# Altium footprint library PcbLib1.PcbLib: 105 footprints (part 3 of 7)
Each footprint in its own frame and in the unit in brackets; x right, y up, seen from the top. Pads: shape width x height; smd on the part's side, far side on the other; paste and mask are expansions set on the pad; w line width, h text height; cw(c..) or ccw(c..) is an arc to the next point about the centre after c.
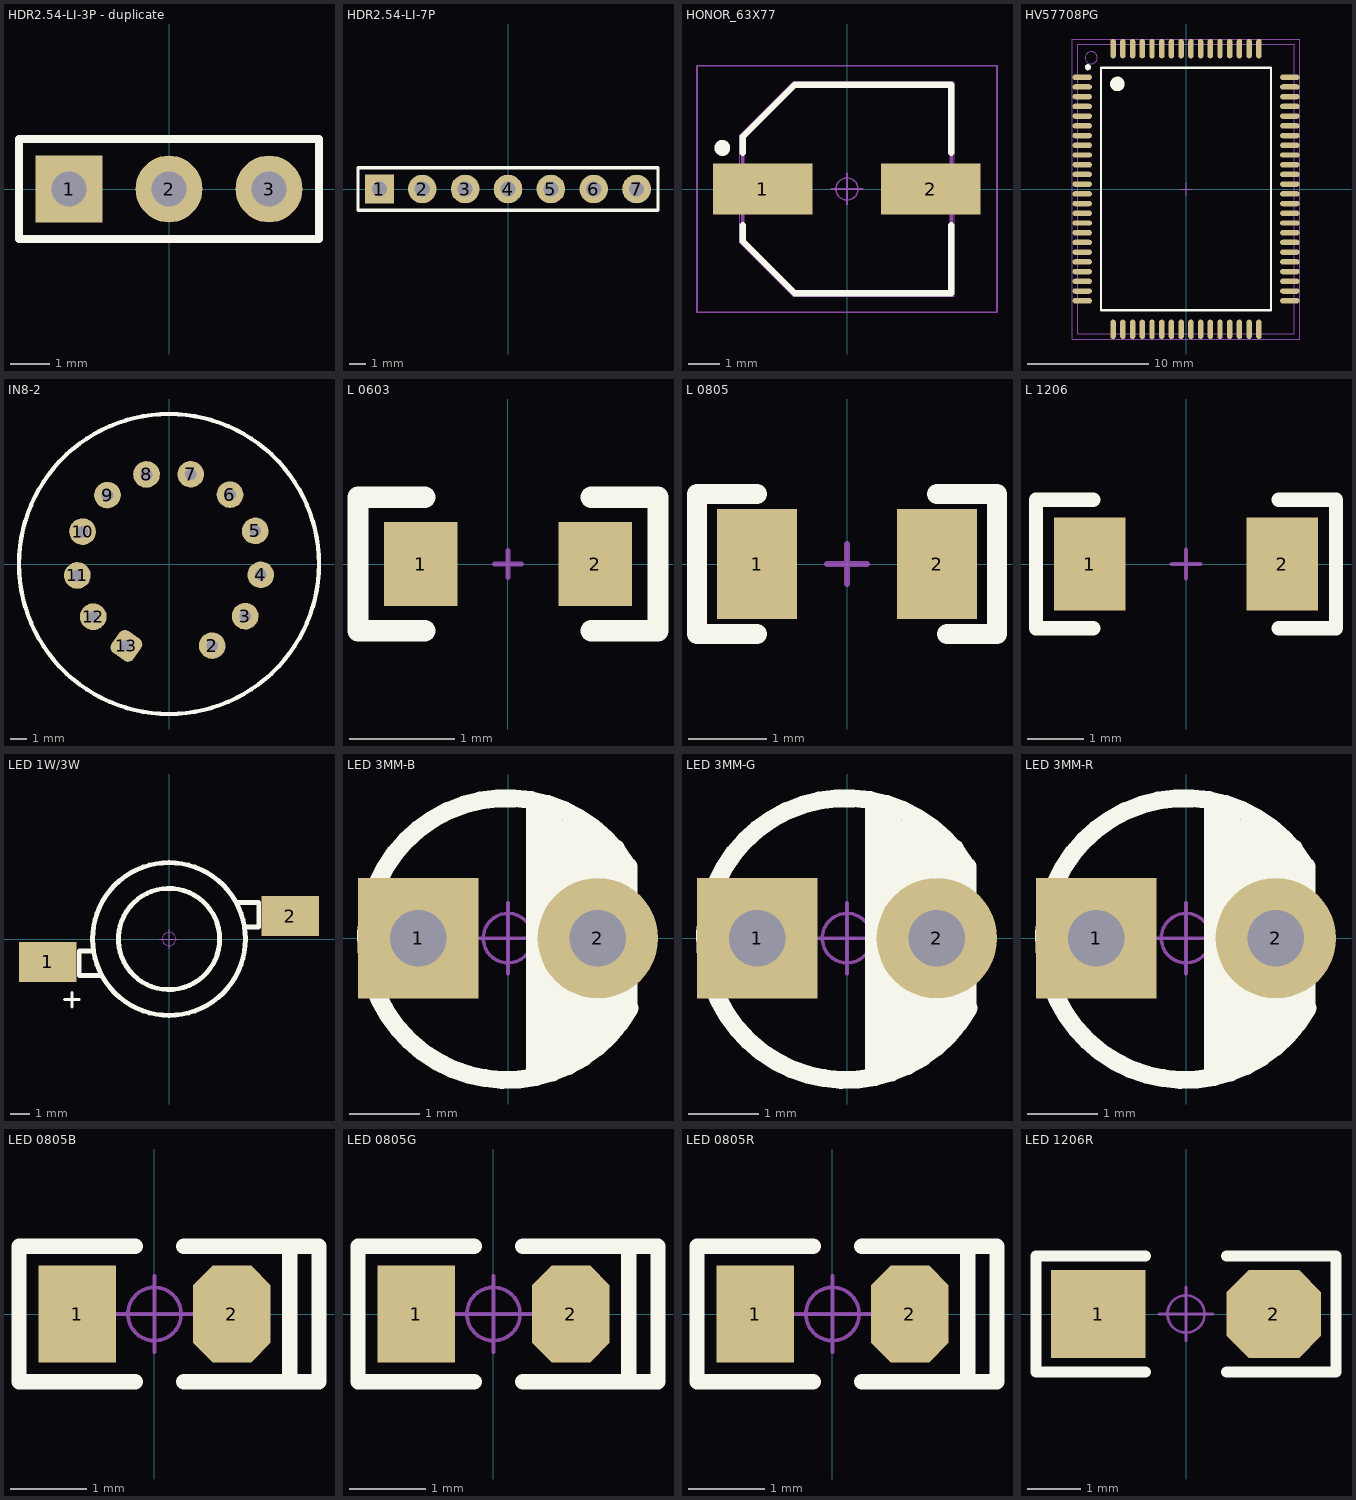
[diagram p2: the footprints below, top view; thin cyan lines are the x and y axes]

## HDR2.54-LI-3P - duplicate [mm] "排针，3脚"
pads (3):
  rect 1.7x1.7 hole 0.9: 1(-2.54,0)
  round 1.7 hole 0.9: 2(0,0) 3(2.54,0)
Top Overlay:
  lines w0.2: -3.81,-1.27 -3.81,1.27 3.81,1.27 3.81,-1.27 -3.81,-1.27

## HDR2.54-LI-7P [mm] "排针，7脚"
pads (7):
  rect 1.7x1.7 hole 0.9: 1(-7.62,0)
  round 1.7 hole 0.9: 2(-5.08,0) 3(-2.54,0) 4(0,0) 5(2.54,0) 6(5.08,0) 7(7.62,0)
Top Overlay:
  lines w0.2: -8.89,-1.27 8.89,-1.27 8.89,1.27 -8.89,1.27 -8.89,-1.27
3D body "HDR2.54-1P.STEP": height 8.5, standoff -3, extent 6.35,-1.27 8.89,1.27
3D body "HDR2.54-1P.STEP": height 8.5, standoff -3, extent 3.81,-1.27 6.35,1.27
3D body "HDR2.54-1P.STEP": height 8.5, standoff -3, extent 1.27,-1.27 3.81,1.27
3D body "HDR2.54-1P.STEP": height 8.5, standoff -3, extent -1.27,-1.27 1.27,1.27
3D body "HDR2.54-1P.STEP": height 8.5, standoff -3, extent -3.81,-1.27 -1.27,1.27
3D body "HDR2.54-1P.STEP": height 8.5, standoff -3, extent -6.35,-1.27 -3.81,1.27
3D body "HDR2.54-1P.STEP": height 8.5, standoff -3, extent -8.89,-1.27 -6.35,1.27

## HONOR_63X77 [mm]
pads (2):
  rect 3.15x1.6 smd: 1(-2.667,0) 2(2.65,0)
Top Overlay:
  circle w0.25: c-3.95,1.3 r0.125
  lines w0.2: -3.3,-1.15 -3.3,-1.65 -1.65,-3.3 3.3,-3.3 3.3,-1.15 ; -3.3,1.15 -3.3,1.65 -1.65,3.3 3.3,3.3 3.3,1.15
Mechanical 1:
  lines w0.1: -3.3,-1.65 -3.3,1.65 -1.65,3.3 3.3,3.3 3.3,-3.3 -1.65,-3.3 -3.3,-1.65
Mechanical 16:
  circle w0.05: c0,0 r0.35
  lines w0.001: -3.4,-1.7 -3.4,1.7 -1.7,3.4 3.4,3.4 3.4,-3.4 -1.7,-3.4 -3.4,-1.7
  lines w0.05: -0.5,0 0.5,0 ; 0,-0.5 0,0.5 ; -4.75,-3.9 -4.75,3.9 4.75,3.9 4.75,-3.9 -4.75,-3.9

## HV57708PG [mm]
pads (80):
  oval 1.6x0.45 smd: 1(-8.55,9.2) 2(-8.55,8.4) 3(-8.55,7.6) 4(-8.55,6.8) 5(-8.55,6) 6(-8.55,5.2) 7(-8.55,4.4) 8(-8.55,3.6) 9(-8.55,2.8) 10(-8.55,2) 11(-8.55,1.2) 12(-8.55,0.4) 13(-8.55,-0.4) 14(-8.55,-1.2) 15(-8.55,-2) 16(-8.55,-2.8) 17(-8.55,-3.6) 18(-8.55,-4.4) 19(-8.55,-5.2) 20(-8.55,-6) 21(-8.55,-6.8) 22(-8.55,-7.6) 23(-8.55,-8.4) 24(-8.55,-9.2) 41(8.55,-9.2) 42(8.55,-8.4) 43(8.55,-7.6) 44(8.55,-6.8) 45(8.55,-6) 46(8.55,-5.2) 47(8.55,-4.4) 48(8.55,-3.6) 49(8.55,-2.8) 50(8.55,-2) 51(8.55,-1.2) 52(8.55,-0.4) 53(8.55,0.4) 54(8.55,1.2) 55(8.55,2) 56(8.55,2.8) 57(8.55,3.6) 58(8.55,4.4) 59(8.55,5.2) 60(8.55,6) 61(8.55,6.8) 62(8.55,7.6) 63(8.55,8.4) 64(8.55,9.2)
  oval 0.45x1.6 smd: 25(-6,-11.55) 26(-5.2,-11.55) 27(-4.4,-11.55) 28(-3.6,-11.55) 29(-2.8,-11.55) 30(-2,-11.55) 31(-1.2,-11.55) 32(-0.4,-11.55) 33(0.4,-11.55) 34(1.2,-11.55) 35(2,-11.55) 36(2.8,-11.55) 37(3.6,-11.55) 38(4.4,-11.55) 39(5.2,-11.55) 40(6,-11.55) 65(6,11.55) 66(5.2,11.55) 67(4.4,11.55) 68(3.6,11.55) 69(2.8,11.55) 70(2,11.55) 71(1.2,11.55) 72(0.4,11.55) 73(-0.4,11.55) 74(-1.2,11.55) 75(-2,11.55) 76(-2.8,11.55) 77(-3.6,11.55) 78(-4.4,11.55) 79(-5.2,11.55) 80(-6,11.55)
Top Overlay:
  circle w0.25: c-8.075,10.025 r0.125
  circle w0.6: c-5.65,8.65 r0.3
  lines w0.2: -7,-10 -7,10 7,10 7,-10 -7,-10
Mechanical 13:
  circle w0.1: c-7.8,10.8 r0.5
  lines w0.1: -8.9,-11.9 -8.9,11.9 8.9,11.9 8.9,-11.9 -8.9,-11.9
Mechanical 15:
  lines w0.05: -9.35,-12.35 -9.35,12.35 9.35,12.35 9.35,-12.35 -9.35,-12.35
  lines w0.1: -0.5,0 0.5,0 ; 0,-0.5 0,0.5
3D body "User Library-QFP80_080.sldprt": height 3.4, standoff 0, extent -8.95,-11.95 8.95,11.95

## IN8-2 [mm]
pads (12):
  round 1.6 hole 0.7: 2(2.592,-4.896) 3(4.571,-3.131) 4(5.502,-0.648) 5(5.172,1.985) 6(3.657,4.161) 7(1.305,5.384) 8(-1.347,5.374) 9(-3.69,4.133) 10(-5.187,1.945) 11(-5.497,-0.689) 12(-4.548,-3.164)
  rrect50% 1.6x1.6 hole 0.7 rot 145: 13(-2.556,-4.915)
Top Overlay:
  circle w0.254: c0,0 r9
3D body "User Library-IN-14-1.sldprt": height 61, standoff 0, extent -9.488,-9.5 9.488,9.5

## L 0603 [mm] "小功率贴片电感        淘宝ID:黄晶宝石"
pads (2):
  rect 0.7x0.8 smd: 1(-0.83,0) 2(0.83,0)
Top Overlay:
  lines w0.203: -0.793,-0.635 -1.428,-0.635 -1.428,0.635 -0.793,0.635 ; 0.793,-0.635 1.428,-0.635 1.428,0.635 0.793,0.635
Mechanical 15:
  lines w0.051: -0.127,0 0.127,0 ; 0,-0.127 0,0 0,0.127
3D body "0603.STEP": height 0.8, standoff 0, extent -0.8,-0.4 0.8,0.4

## L 0805 [mil] "小功率贴片电感        淘宝ID:黄晶宝石"
pads (2):
  rect 40x55 smd: 1(-45,0) 2(45,0)
Top Overlay:
  lines w10: -45,-35 -75,-35 -75,35 -45,35 ; 45,35 75,35 75,-35 50,-35
Mechanical 15:
  lines w3: -10,0 10,0 ; 0,-10 0,10
3D body "0805.STEP": height 35.43, standoff -0.11, extent -39.37,-23.62 39.37,23.62

## L 1206 [mil] "小功率贴片电感        淘宝ID:黄晶宝石"
pads (2):
  rect 50x65 smd: 1(-67.5,0) 2(67.5,0)
Top Overlay:
  lines w10: -65,-45 -105,-45 -105,45 -65,45 ; 65,-45 105,-45 105,45 65,45
Mechanical 15:
  lines w3: -10,0 10,0 ; 0,-10 0,10
3D body "1206.STEP": height 35.43, standoff -0.19, extent -62.99,-31.5 62.99,31.5

## LED 1W/3W [mm] "大功率LED                      淘宝ID:黄晶宝石"
pads (2):
  rect 3x2.1 smd: 1(-6.35,-1.2) 2(6.35,1.2)
Top Overlay:
  circle w0.254: c0,0 r2.65
  circle w0.254: c0,0 r4
  lines w0.15: -5.461,-3.175 -4.699,-3.175 ; -5.08,-3.556 -5.08,-2.794
  lines w0.254: -4.064,-0.635 -4.699,-0.635 -4.699,-1.905 -3.556,-1.905 ; 3.556,1.905 4.699,1.905 4.699,0.635 4.064,0.635
Mechanical 15:
  circle w0.05: c0,0 r0.35
  lines w0.05: -0.5,0 0.5,0 ; 0,-0.5 0,0.5
3D body "User Library-LED Case Lambertian II_Imported.sldprt": height 0.22, standoff -0.08, extent -2.629,-2.6 2.565,2.59
3D body "User Library-LED Case Lambertian II_Imported1.sldprt": height 2.62, standoff 0.22, extent -3.732,-3.988 3.668,3.988
3D body "User Library-LED Case Lambertian II_Imported2.sldprt": height 2.42, standoff 2.22, extent -1.239,-1.124 1.161,1.276
3D body "User Library-LED Case Lambertian II_Imported3.sldprt": height 5.49, standoff 2.39, extent -3.132,-3.1 3.066,3.091
3D body "User Library-LED Case Lambertian II_Imported5.sldprt": height 2.62, standoff 2.12, extent -3.52,-3.5 3.456,3.5
3D body "User Library-LED Case Lambertian II_Imported6.sldprt": height 1.52, standoff 0.02, extent 3.548,0.338 7.148,1.838
3D body "User Library-LED Case Lambertian II_Imported8.sldprt": height 1.52, standoff 0.02, extent -7.211,-1.838 -3.611,-0.338
3D body "User Library-LED Case Lambertian II_Imported9.sldprt": height 1.52, standoff 1.42, extent -4.219,0.038 -3.619,1.538
3D body "User Library-LED Case Lambertian II_Imported7.sldprt": height 1.52, standoff 1.42, extent 3.549,-1.538 4.649,-0.038

## LED 3MM-B [mm] "蓝色3mm直插LED                                 淘宝ID:黄晶宝石"
height 6.35
pads (2):
  rect 1.7x1.7 hole 0.8: 1(-1.27,0)
  round 1.7 hole 0.8: 2(1.27,0)
Top Overlay:
  lines w0.254: 0.381,-1.905 0.381,1.905 ; 0.635,-1.778 0.635,1.778 ; 1.016,-1.651 1.016,1.524 ; 1.524,1.27 1.524,-1.27 1.27,-1.524 1.27,1.397 1.143,1.524 1.016,1.524 ; 1.685,1.025 ccw(c-0.016,-0.012) 1.72,-0.987 ; 1.702,-0.965 1.702,1.016 ; 0.889,1.651 1.016,1.524 ; 0.889,1.651 0.889,-1.778 0.889,1.651
Mechanical 15:
  circle w0.05: c0,0 r0.35
  lines w0.05: -0.5,0 0.5,0 ; 0,-0.5 0,0.5
3D body "LED 3mm-B.STEP": height 3, standoff -3.45, extent -1.623,-0.838 1.618,0.838
3D body "LED 3mm-玻璃罩.STEP": height 5.55, standoff 0.05, extent -1.95,-1.95 1.638,1.95

## LED 3MM-G [mm] "绿色3mm直插LED                                 淘宝ID:黄晶宝石"
height 6.35
pads (2):
  rect 1.7x1.7 hole 0.8: 1(-1.27,0)
  round 1.7 hole 0.8: 2(1.27,0)
Top Overlay:
  lines w0.254: 0.381,-1.905 0.381,1.905 ; 0.635,-1.778 0.635,1.778 ; 1.016,-1.651 1.016,1.524 ; 1.524,1.27 1.524,-1.27 1.27,-1.524 1.27,1.397 1.143,1.524 1.016,1.524 ; 1.685,1.025 ccw(c-0.016,-0.012) 1.72,-0.987 ; 1.702,-0.965 1.702,1.016 ; 0.889,1.651 0.889,-1.778 0.889,1.651 ; 0.889,1.651 1.016,1.524
Mechanical 15:
  circle w0.05: c0,0 r0.35
  lines w0.05: -0.5,0 0.5,0 ; 0,-0.5 0,0.5
3D body "LED 3mm-玻璃罩.STEP": height 5.55, standoff 0.05, extent -1.95,-1.95 1.638,1.95
3D body "LED 3mm-G.STEP": height 3.01, standoff -3.45, extent -1.623,-0.838 1.618,0.838

## LED 3MM-R [mm] "红色3mm直插LED                                   淘宝ID:黄晶宝石"
height 6.35
pads (2):
  rect 1.7x1.7 hole 0.8: 1(-1.27,0)
  round 1.7 hole 0.8: 2(1.27,0)
Top Overlay:
  lines w0.254: 0.381,-1.905 0.381,1.905 ; 0.635,-1.778 0.635,1.778 ; 1.016,-1.651 1.016,1.524 ; 1.524,1.27 1.524,-1.27 1.27,-1.524 1.27,1.397 1.143,1.524 1.016,1.524 ; 1.685,1.025 ccw(c-0.016,-0.012) 1.72,-0.987 ; 1.702,-0.965 1.702,1.016 ; 0.889,1.651 0.889,-1.778 0.889,1.651 ; 0.889,1.651 1.016,1.524
Mechanical 15:
  circle w0.05: c0,0 r0.35
  lines w0.05: -0.5,0 0.5,0 ; 0,-0.5 0,0.5
3D body "LED 3mm-玻璃罩.ST": height 5.55, standoff 0.05, extent -1.95,-1.95 1.638,1.95
3D body "LED 3mm-R.STEP": height 3.01, standoff -3.45, extent -1.623,-0.838 1.618,0.838

## LED 0805B [mil] "蓝色0805LED                                    淘宝ID:黄晶宝石"
pads (2):
  rect 40x50 smd: 1(-40,0)
  oct 40x50 smd: 2(40,0)
Top Overlay:
  lines w8: -10,-35 -70,-35 -70,35 -10,35 ; 15,-35 85,-35 85,35 15,35 ; 70,-35 70,35
Mechanical 15:
  circle w1.97: c0,0 r13.78
  lines w1.97: -19.68,0 19.68,0 ; 0,-19.68 0,19.68
3D body "LED 0805-B.STEP": height 26.33, standoff -0.16, extent -39.37,-24.65 39.37,24.65
3D body "LED 0805玻璃罩.STEP": height 31.69, standoff 12.01, extent -29.49,-24.65 29.49,24.65

## LED 0805G [mil] "绿色0805LED                              淘宝ID:黄晶宝石"
pads (2):
  rect 40x50 smd: 1(-40,0)
  oct 40x50 smd: 2(40,0)
Top Overlay:
  lines w8: -10,-35 -70,-35 -70,35 -10,35 ; 15,-35 85,-35 85,35 15,35 ; 70,-35 70,35
Mechanical 15:
  circle w1.97: c0,0 r13.78
  lines w1.97: -19.68,0 19.68,0 ; 0,-19.68 0,19.68
3D body "LED 0805-G.STEP": height 26.33, standoff -0.16, extent -39.37,-24.65 39.37,24.65
3D body "LED 0805玻璃罩.ST": height 31.69, standoff 12.01, extent -29.49,-24.65 29.49,24.65

## LED 0805R [mil] "红色0805LED                                       淘宝ID:黄晶宝石"
pads (2):
  rect 40x50 smd: 1(-40,0)
  oct 40x50 smd: 2(40,0)
Top Overlay:
  lines w8: -10,-35 -70,-35 -70,35 -10,35 ; 15,-35 85,-35 85,35 15,35 ; 70,-35 70,35
Mechanical 15:
  circle w1.97: c0,0 r13.78
  lines w1.97: -19.68,0 19.68,0 ; 0,-19.68 0,19.68
3D body "LED 0805-R.STEP": height 26.33, standoff -0.16, extent -39.37,-24.65 39.37,24.64
3D body "LED 0805玻璃罩.ST": height 31.69, standoff 12.01, extent -29.49,-24.65 29.49,24.65

## LED 1206R [mil] "红色1206LED       淘宝ID:黄晶宝石"
pads (2):
  rect 70x65 smd: 1(-65,0)
  oct 70x65 smd: 2(65,0)
Top Overlay:
  lines w8: -30,-43 -111,-43 -111,43 -109,43 -30,43 ; 30,-43 109,-43 ; 30,43 111,43 111,-43
Mechanical 15:
  circle w1.97: c0,0 r13.78
  lines w1.97: -19.68,0 19.68,0 ; 0,-19.68 0,19.68
3D body "LED 1206玻璃罩.ST": height 0, standoff 0, extent 0,0 0,0
3D body "LED 1206-R.STEP": height 35.58, standoff -0.16, extent -63.03,-31.54 63.03,31.54